# Altium footprint library ICs And Semiconductors SMD.PcbLib: 943 footprints (part 4 of 60)
Each footprint in its own frame and in the unit in brackets; x right, y up, seen from the top. Pads: shape width x height; smd on the part's side, far side on the other; paste and mask are expansions set on the pad; w line width, h text height; cw(c..) or ccw(c..) is an arc to the next point about the centre after c.
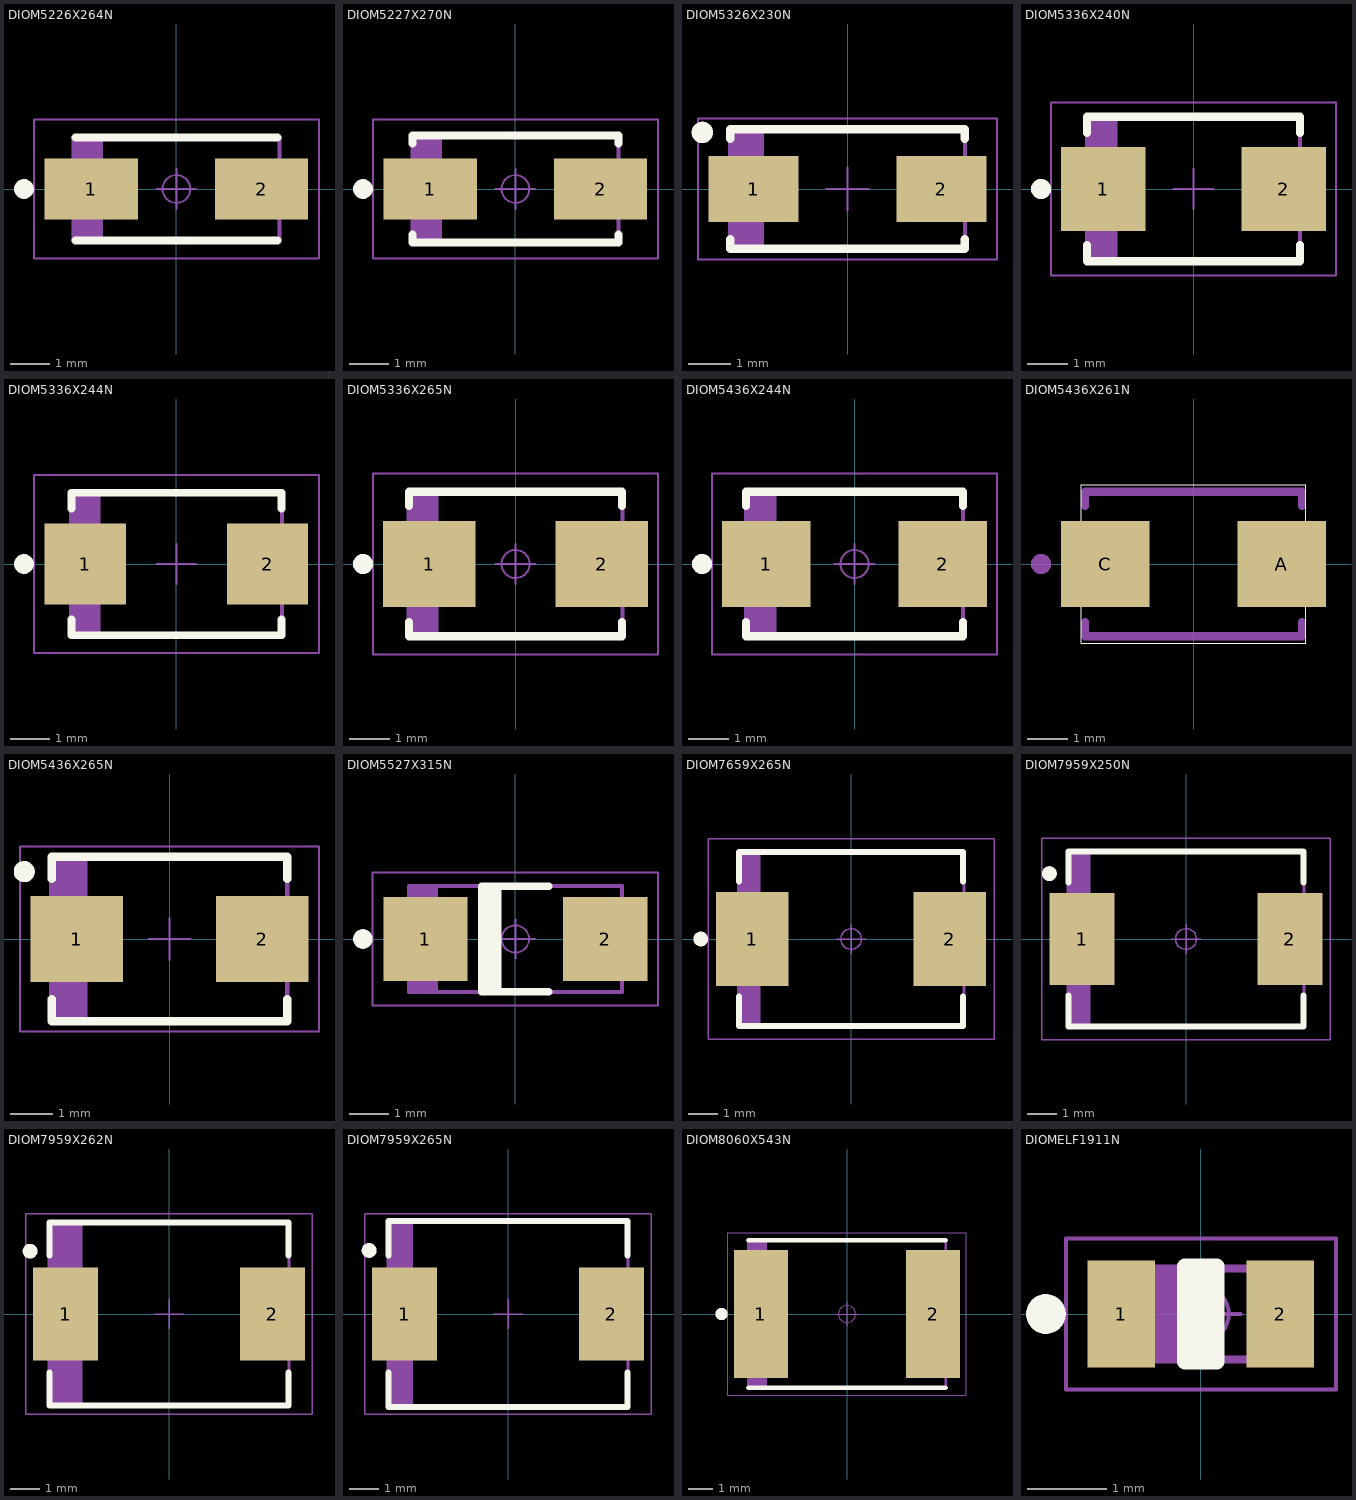
[diagram p3: the footprints below, top view; thin cyan lines are the x and y axes]

## DIOM5226X264N [mm] "DO-214-AC/SMA Diode, Molded Body; 5.195mm L X 2.585mm W X 2.64mm H, IPC Medium Density"
height 2.64
pads (2):
  rect 2.35x1.55 smd: 1(-2.15,0) 2(2.15,0)
Top Overlay:
  circle w0.25: c-3.85,0 r0.125
  lines w0.2: -2.55,-1.3 2.55,-1.3 ; -2.55,1.3 2.55,1.3
Mechanical 14:
  lines w0.1: -2.498,-1.292 -2.498,1.292 ; -2.398,-1.292 -2.398,1.292 ; -2.298,-1.292 -2.298,1.292 ; -2.198,-1.292 -2.198,1.292 ; -2.098,-1.292 -2.098,1.292 ; -1.998,-1.292 -1.998,1.292 ; -1.898,-1.292 -1.898,1.292 ; -2.598,-1.292 2.598,-1.292 2.598,1.292 -2.598,1.292 ; -2.598,-1.292 -2.598,1.292 ; -2.598,-1.292 -2.598,1.292
Mechanical 15:
  circle w0.05: c0,0 r0.35
  lines w0.05: -0.5,0 0.5,0 ; 0,-0.5 0,0.5 ; -3.6,-1.75 3.6,-1.75 3.6,1.75 -3.6,1.75 -3.6,-1.75
3D body "DIOM5226X264N.stp": height 2.64, standoff 0, extent -2.6,-1.3 2.6,1.305

## DIOM5227X270N [mm] "DO-214-AC/SMA Diode, Molded Body;5.20mm L X 2.725mm W X 2.70mm H, IPC Medium Density"
height 2.7
pads (2):
  rect 2.35x1.55 smd: 1(-2.15,0) 2(2.15,0)
Top Overlay:
  circle w0.25: c-3.85,0 r0.125
  lines w0.2: -2.6,-1.15 -2.6,-1.35 2.6,-1.35 2.6,-1.15 ; -2.6,1.15 -2.6,1.35 2.6,1.35 2.6,1.15
Mechanical 14:
  lines w0.1: -2.5,-1.362 -2.5,1.362 ; -2.4,-1.362 -2.4,1.362 ; -2.3,-1.362 -2.3,1.362 ; -2.2,-1.362 -2.2,1.362 ; -2.1,-1.362 -2.1,1.362 ; -2,-1.362 -2,1.362 ; -1.9,-1.362 -1.9,1.362 ; -2.6,-1.362 2.6,-1.362 2.6,1.362 -2.6,1.362 ; -2.6,-1.362 -2.6,1.362 ; -2.6,-1.362 -2.6,1.362
Mechanical 15:
  circle w0.05: c0,0 r0.35
  lines w0.05: -0.5,0 0.5,0 ; 0,-0.5 0,0.5 ; -3.6,-1.75 3.6,-1.75 3.6,1.75 -3.6,1.75 -3.6,-1.75
3D body "DIOM5227X270N.stp": height 2.7, standoff 0, extent -2.6,-1.3 2.6,1.305

## DIOM5326X230N [mm] "DO-214-AC/SMA Molded Diode, Body 5.3x2.6mm, IPC Medium Density"
height 2.3
pads (2):
  rect 2.1x1.55 smd: 1(-2.2,0) 2(2.2,0)
Top Overlay:
  circle w0.25: c-3.4,1.325 r0.125
  lines w0.2: -2.75,-1.175 -2.75,-1.4 2.75,-1.4 2.75,-1.175 ; -2.75,1.175 -2.75,1.4 2.75,1.4 2.75,1.175
Mechanical 14:
  lines w0.1: -2.66,-1.4 -2.66,1.4 ; -2.61,-1.4 -2.61,1.4 ; -2.535,-1.4 -2.535,1.4 ; -2.46,-1.4 -2.46,1.4 ; -2.385,-1.4 -2.385,1.4 ; -2.31,-1.4 -2.31,1.4 ; -2.235,-1.4 -2.235,1.4 ; -2.16,-1.4 -2.16,1.4 ; -2.085,-1.4 -2.085,1.4 ; -2.01,-1.4 -2.01,1.4 ; -2.75,-1.4 2.75,-1.4 2.75,1.4 -2.75,1.4 -2.75,-1.4
Mechanical 15:
  lines w0.05: -0.5,0 0.5,0 ; 0,-0.5 0,0.5 ; -3.5,-1.65 3.5,-1.65 3.5,1.65 -3.5,1.65 -3.5,-1.65
3D body "DIOM5326X230N.stp": height 2.3, standoff 0, extent -2.75,-1.4 2.75,1.4

## DIOM5336X240N [mm] "DO-214-AA/SMB Molded Diode, 2-Leads, Body 5.3x3.6mm, IPC Medium Density"
height 2.4
pads (2):
  rect 2.1x2.1 smd: 1(-2.25,0) 2(2.25,0)
Top Overlay:
  circle w0.25: c-3.8,0 r0.125
  lines w0.2: -2.65,-1.4 -2.65,-1.8 2.65,-1.8 2.65,-1.4 ; -2.65,1.4 -2.65,1.8 2.65,1.8 2.65,1.4
Mechanical 14:
  lines w0.1: -2.55,-1.775 -2.55,1.775 ; -2.45,-1.775 -2.45,1.775 ; -2.35,-1.775 -2.35,1.775 ; -2.25,-1.775 -2.25,1.775 ; -2.15,-1.775 -2.15,1.775 ; -2.05,-1.775 -2.05,1.775 ; -1.95,-1.775 -1.95,1.775 ; -2.65,-1.775 2.65,-1.775 2.65,1.775 -2.65,1.775 -2.65,-1.775
Mechanical 15:
  lines w0.05: -0.5,0 0.5,0 ; 0,-0.5 0,0.5 ; -3.55,-2.15 3.55,-2.15 3.55,2.15 -3.55,2.15 -3.55,-2.15
3D body "DIOM5336X240N.stp": height 2.4, standoff 0, extent -2.7,-1.95 2.7,1.95

## DIOM5336X244N [mm] "DO-214-AA/SMB Molded Diode, 2-Leads, Body 5.3x3.6mm, IPC Medium Density"
height 2.44
pads (2):
  rect 2.05x2.05 smd: 1(-2.3,0) 2(2.3,0)
Top Overlay:
  circle w0.25: c-3.85,0 r0.125
  lines w0.2: -2.65,-1.4 -2.65,-1.8 2.65,-1.8 2.65,-1.4 ; -2.65,1.4 -2.65,1.8 2.65,1.8 2.65,1.4
Mechanical 14:
  lines w0.1: -2.568,-1.81 -2.568,1.81 ; -2.468,-1.81 -2.468,1.81 ; -2.368,-1.81 -2.368,1.81 ; -2.268,-1.81 -2.268,1.81 ; -2.168,-1.81 -2.168,1.81 ; -2.068,-1.81 -2.068,1.81 ; -1.968,-1.81 -1.968,1.81 ; -2.668,-1.81 2.668,-1.81 2.668,1.81 -2.668,1.81 -2.668,-1.81
Mechanical 15:
  lines w0.05: -0.5,0 0.5,0 ; 0,-0.5 0,0.5 ; -3.6,-2.25 3.6,-2.25 3.6,2.25 -3.6,2.25 -3.6,-2.25
3D body "DIOM5336X244N.stp": height 2.44, standoff 0, extent -2.7,-1.95 2.7,1.95

## DIOM5336X265N [mm] "DO-214-AA/SMB Diode, Molded Body; 5.34mm L X 3.625mm W X 2.65mm H, IPC Medium Density"
height 2.65
pads (2):
  rect 2.3x2.15 smd: 1(-2.15,0) 2(2.15,0)
Top Overlay:
  circle w0.25: c-3.8,0 r0.125
  lines w0.2: -2.65,-1.45 -2.65,-1.8 2.65,-1.8 2.65,-1.45 ; -2.65,1.45 -2.65,1.8 2.65,1.8 2.65,1.45
Mechanical 14:
  lines w0.1: -2.57,-1.812 -2.57,1.812 ; -2.47,-1.812 -2.47,1.812 ; -2.37,-1.812 -2.37,1.812 ; -2.27,-1.812 -2.27,1.812 ; -2.17,-1.812 -2.17,1.812 ; -2.07,-1.812 -2.07,1.812 ; -1.97,-1.812 -1.97,1.812 ; -2.67,-1.812 2.67,-1.812 2.67,1.812 -2.67,1.812 ; -2.67,-1.812 -2.67,1.812 ; -2.67,-1.812 -2.67,1.812
Mechanical 15:
  circle w0.05: c0,0 r0.35
  lines w0.05: -0.5,0 0.5,0 ; 0,-0.5 0,0.5 ; -3.55,-2.25 3.55,-2.25 3.55,2.25 -3.55,2.25 -3.55,-2.25
3D body "DIOM5336X240N.stp": height 2.4, standoff 0, extent -2.7,-1.95 2.7,1.95

## DIOM5436X244N [mm] "DO-214-AA/SMB Diode, Molded Body; 5.40mm L X 3.62mm W X 2.44mm H, IPC Medium Density"
height 2.44
pads (2):
  rect 2.2x2.15 smd: 1(-2.2,0) 2(2.2,0)
Top Overlay:
  circle w0.25: c-3.8,0 r0.125
  lines w0.2: -2.7,-1.45 -2.7,-1.8 2.7,-1.8 2.7,-1.45 ; -2.7,1.45 -2.7,1.8 2.7,1.8 2.7,1.45
Mechanical 14:
  lines w0.1: -2.6,-1.81 -2.6,1.81 ; -2.5,-1.81 -2.5,1.81 ; -2.4,-1.81 -2.4,1.81 ; -2.3,-1.81 -2.3,1.81 ; -2.2,-1.81 -2.2,1.81 ; -2.1,-1.81 -2.1,1.81 ; -2,-1.81 -2,1.81 ; -2.7,-1.81 -2.7,1.81 ; -2.7,-1.81 -2.7,1.81 ; -2.7,-1.81 2.7,-1.81 2.7,1.81 -2.7,1.81
Mechanical 15:
  circle w0.05: c0,0 r0.35
  lines w0.05: -0.5,0 0.5,0 ; 0,-0.5 0,0.5 ; -3.55,-2.25 -3.55,2.25 3.55,2.25 3.55,-2.25 -3.55,-2.25
3D body "DIOM5436X244N.stp": height 2.44, standoff 0, extent -2.7,-1.95 2.7,1.95

## DIOM5436X261N [mm]
pads (2):
  rect 2.2x2.15 smd: A(2.2,0) C(-2.2,0)
Bottom Layer:
  text "1" at 0.45,-0.164 h0.75
Top Overlay:
  lines w0.001: -2.795,-1.97 -2.795,1.97 2.795,1.97 2.795,-1.97 -2.795,-1.97
Top Solder:
  circle w0.05: c0,0 r0.35
  lines w0.05: -0.5,0 0.5,0 ; 0,-0.5 0,0.5 ; -3.55,-2.25 -3.55,2.25 3.55,2.25 3.55,-2.25 -3.55,-2.25
Bottom Solder:
  lines w0.1: -2.6,-1.81 -2.6,1.81 ; -2.5,-1.81 -2.5,1.81 ; -2.4,-1.81 -2.4,1.81 ; -2.3,-1.81 -2.3,1.81 ; -2.2,-1.81 -2.2,1.81 ; -2.1,-1.81 -2.1,1.81 ; -2,-1.81 -2,1.81 ; -2.7,-1.81 -2.7,1.81 ; -2.7,-1.81 -2.7,1.81 ; -2.7,-1.81 2.7,-1.81 2.7,1.81 -2.7,1.81
  text "1" at -0.45,0.164 h0.75
Mechanical 15:
  circle w0.25: c-3.8,0 r0.125
  lines w0.2: -2.7,-1.45 -2.7,-1.8 2.7,-1.8 2.7,-1.45 ; -2.7,1.45 -2.7,1.8 2.7,1.8 2.7,1.45

## DIOM5436X265N [mm] "DO-214-AA/SMB Molded Diode, Body 5.4x3.6mm, IPC Medium Density"
height 2.65
pads (2):
  rect 2.2x2.05 smd: 1(-2.2,0) 2(2.2,0)
Top Overlay:
  circle w0.25: c-3.45,1.6 r0.125
  lines w0.2: -2.8,-1.425 -2.8,-1.95 2.8,-1.95 2.8,-1.425 ; -2.8,1.425 -2.8,1.95 2.8,1.95 2.8,1.425
Mechanical 13:
  lines w0.001: -2.845,-1.97 2.845,-1.97 2.845,1.97 -2.845,1.97 -2.845,-1.97 ; -2.795,-1.95 -2.795,1.95 2.795,1.95 2.795,-1.95 -2.795,-1.95
Mechanical 14:
  lines w0.1: -2.695,-1.95 -2.695,1.95 ; -2.595,-1.95 -2.595,1.95 ; -2.495,-1.95 -2.495,1.95 ; -2.395,-1.95 -2.395,1.95 ; -2.295,-1.95 -2.295,1.95 ; -2.195,-1.95 -2.195,1.95 ; -2.095,-1.95 -2.095,1.95 ; -1.995,-1.95 -1.995,1.95 ; -2.795,-1.95 -2.795,1.95 2.795,1.95 2.795,-1.95 -2.795,-1.95
Mechanical 15:
  lines w0.05: -0.5,0 0.5,0 ; 0,-0.5 0,0.5 ; -3.55,-2.2 -3.55,2.2 3.55,2.2 3.55,-2.2 -3.55,-2.2
3D body "DIOM5436X265N.stp": height 2.65, standoff 0, extent -2.8,-1.95 2.8,1.95

## DIOM5527X315N [mm] "DO-214-AC/SMB Diode, Molded Body; 5.45mm L X 2.705mm W X 3.15mm H, IPC Medium Density"
height 3.15
pads (2):
  rect 2.15x2.15 smd: 1(-2.3,0) 2(2.3,0)
Top Overlay:
  circle w0.25: c-3.9,0 r0.125
  lines w0.2: -0.65,-1.35 -0.65,1.35 ; -0.45,-1.35 -0.45,1.35 ; 0.85,-1.35 -0.85,-1.35 -0.85,1.35 0.85,1.35
Mechanical 14:
  lines w0.1: -2.625,-1.352 -2.625,1.352 ; -2.525,-1.352 -2.525,1.352 ; -2.425,-1.352 -2.425,1.352 ; -2.325,-1.352 -2.325,1.352 ; -2.225,-1.352 -2.225,1.352 ; -2.125,-1.352 -2.125,1.352 ; -2.025,-1.352 -2.025,1.352 ; -2.725,-1.352 -2.725,1.352 ; -2.725,-1.352 -2.725,1.352 ; -2.725,-1.352 2.725,-1.352 2.725,1.352 -2.725,1.352
Mechanical 15:
  circle w0.05: c0,0 r0.35
  lines w0.05: -0.5,0 0.5,0 ; 0,-0.5 0,0.5 ; -3.65,-1.7 -3.65,1.7 3.65,1.7 3.65,-1.7 -3.65,-1.7
3D body "DIOM5527X315N.stp": height 3.15, standoff 0, extent -2.845,-1.42 2.845,1.42

## DIOM7659X265N [mm] "DO-214-AB/SMC Molded Diode, Body 7.95x5.9mm, IPC Medium Density"
height 2.65
pads (2):
  rect 2.45x3.2 smd: 1(-3.35,0) 2(3.35,0)
Top Overlay:
  circle w0.25: c-5.1,0 r0.125
  lines w0.2: -3.8,-1.95 -3.8,-2.95 3.8,-2.95 3.8,-1.95 ; -3.8,1.95 -3.8,2.95 3.8,2.95 3.8,1.95
Mechanical 14:
  lines w0.1: -3.725,-2.95 -3.725,2.95 ; -3.625,-2.95 -3.625,2.95 ; -3.525,-2.95 -3.525,2.95 ; -3.425,-2.95 -3.425,2.95 ; -3.325,-2.95 -3.325,2.95 ; -3.225,-2.95 -3.225,2.95 ; -3.125,-2.95 -3.125,2.95 ; -3.825,-2.95 -3.825,2.95 3.825,2.95 3.825,-2.95 -3.825,-2.95
Mechanical 15:
  circle w0.05: c0,0 r0.35
  lines w0.05: -0.5,0 0.5,0 ; 0,-0.5 0,0.5 ; -4.85,-3.4 -4.85,3.4 4.85,3.4 4.85,-3.4 -4.85,-3.4
3D body "DIOM7659X265N.stp": height 2.65, standoff 0, extent -3.975,-2.95 3.975,2.95

## DIOM7959X250N [mm] "DO-214-AB/SMC Molded Diode, Body 7.9x5.9mm, IPC Medium Density"
height 2.5
pads (2):
  rect 2.2x3.1 smd: 1(-3.5,0) 2(3.5,0)
Top Overlay:
  circle w0.25: c-4.6,2.2 r0.125
  lines w0.2: -3.95,-1.9 -3.95,-2.95 3.95,-2.95 3.95,-1.9 ; -3.95,1.9 -3.95,2.95 3.95,2.95 3.95,1.9
Mechanical 14:
  lines w0.1: -3.87,-2.952 -3.87,2.952 ; -3.77,-2.952 -3.77,2.952 ; -3.67,-2.952 -3.67,2.952 ; -3.57,-2.952 -3.57,2.952 ; -3.47,-2.952 -3.47,2.952 ; -3.37,-2.952 -3.37,2.952 ; -3.27,-2.952 -3.27,2.952 ; -3.97,-2.952 -3.97,2.952 ; -3.97,-2.952 -3.97,2.952 ; -3.97,-2.952 3.97,-2.952 3.97,2.952 -3.97,2.952
Mechanical 15:
  circle w0.05: c0,0 r0.35
  lines w0.05: -0.5,0 0.5,0 ; 0,-0.5 0,0.5 ; -4.85,-3.4 -4.85,3.4 4.85,3.4 4.85,-3.4 -4.85,-3.4
3D body "DIOM7959X250N.stp": height 2.5, standoff 0, extent -4.065,-3.11 4.065,3.11

## DIOM7959X262N [mm] "DO-214-AB/SMC Molded Diode, Body 7.9x5.9mm, IPC Medium Density"
height 2.62
pads (2):
  rect 2.2x3.15 smd: 1(-3.5,0) 2(3.5,0)
Top Overlay:
  circle w0.25: c-4.7,2.125 r0.125
  lines w0.2: -4.05,-1.975 -4.05,-3.1 4.05,-3.1 4.05,-1.975 ; -4.05,1.975 -4.05,3.1 4.05,3.1 4.05,1.975
Mechanical 14:
  lines w0.1: -4,-3.11 -4,3.11 ; -3.95,-3.11 -3.95,3.11 ; -3.875,-3.11 -3.875,3.11 ; -3.8,-3.11 -3.8,3.11 ; -3.725,-3.11 -3.725,3.11 ; -3.65,-3.11 -3.65,3.11 ; -3.575,-3.11 -3.575,3.11 ; -3.5,-3.11 -3.5,3.11 ; -3.425,-3.11 -3.425,3.11 ; -3.35,-3.11 -3.35,3.11 ; -3.275,-3.11 -3.275,3.11 ; -3.2,-3.11 -3.2,3.11 ; -3.125,-3.11 -3.125,3.11 ; -3.05,-3.11 -3.05,3.11 ; -2.975,-3.11 -2.975,3.11 ; -4.065,-3.11 -4.065,3.11 4.065,3.11 4.065,-3.11 -4.065,-3.11
Mechanical 15:
  lines w0.05: -0.5,0 0.5,0 ; 0,-0.5 0,0.5 ; -4.85,-3.4 -4.85,3.4 4.85,3.4 4.85,-3.4 -4.85,-3.4
3D body "DIOM7959X262N.stp": height 2.62, standoff 0, extent -4.065,-3.11 4.065,3.11

## DIOM7959X265N [mm] "DO-214-AB/SMC Molded Diode, Body 7.9x5.9mm, IPC Medium Density"
height 2.65
pads (2):
  rect 2.2x3.15 smd: 1(-3.5,0) 2(3.5,0)
Top Overlay:
  circle w0.25: c-4.7,2.15 r0.125
  lines w0.2: -4.05,-1.975 -4.05,-3.15 4.05,-3.15 4.05,-1.975 ; -4.05,1.975 -4.05,3.15 4.05,3.15 4.05,1.975
Mechanical 13:
  lines w0.001: -4.065,-3.15 -4.065,3.15 4.065,3.15 4.065,-3.15 -4.065,-3.15
Mechanical 14:
  lines w0.1: -3.965,-3.15 -3.965,3.15 ; -3.865,-3.15 -3.865,3.15 ; -3.765,-3.15 -3.765,3.15 ; -3.665,-3.15 -3.665,3.15 ; -3.565,-3.15 -3.565,3.15 ; -3.465,-3.15 -3.465,3.15 ; -3.365,-3.15 -3.365,3.15 ; -3.265,-3.15 -3.265,3.15 ; -4.065,-3.15 -4.065,3.15 4.065,3.15 4.065,-3.15 -4.065,-3.15
Mechanical 15:
  lines w0.05: -0.5,0 0.5,0 ; 0,-0.5 0,0.5 ; -4.85,-3.4 -4.85,3.4 4.85,3.4 4.85,-3.4 -4.85,-3.4
3D body "DIOM7959X265N.stp": height 2.65, standoff 0, extent -4.065,-3.11 4.065,3.11

## DIOM8060X543N [mm] "DO-214-AB (HSMC) Molded Diode, Body 6.025 x 6.13mm, IPC Medium Density"
height 5.43
pads (2):
  rect 2.2x5.2 smd: 1(-3.5,0) 2(3.5,0)
Top Overlay:
  circle w0.25: c-5.1,0 r0.125
  lines w0.2: -4,-3 4,-3 ; -4,3 4,3
Mechanical 14:
  lines w0.1: -3.908,-3.012 -3.908,3.012 ; -3.808,-3.012 -3.808,3.012 ; -3.708,-3.012 -3.708,3.012 ; -3.608,-3.012 -3.608,3.012 ; -3.508,-3.012 -3.508,3.012 ; -3.408,-3.012 -3.408,3.012 ; -3.308,-3.012 -3.308,3.012 ; -4.008,-3.012 4.008,-3.012 4.008,3.012 -4.008,3.012 ; -4.008,-3.012 -4.008,3.012 ; -4.008,-3.012 -4.008,3.012
Mechanical 15:
  circle w0.05: c0,0 r0.35
  lines w0.05: -0.5,0 0.5,0 ; 0,-0.5 0,0.5 ; -4.85,-3.3 4.85,-3.3 4.85,3.3 -4.85,3.3 -4.85,-3.3
3D body "DIOM8060X543N.stp": height 5.43, standoff 0, extent -4.09,-3.05 4.09,3.05

## DIOMELF1911N [mm] "MELF Diode, 2-Leads, Body 1.7x1.15mm, IPC Medium Density"
height 1.2
pads (2):
  rect 0.85x1.35 smd: 1(-1,0) 2(1,0)
Top Overlay:
  circle w0.25: c-1.95,0 r0.125
  lines w0.2: 0,-0.6 0,0.6 ; -0.2,-0.6 0.2,-0.6 0.2,0.6 -0.2,0.6 -0.2,-0.6
Mechanical 14:
  lines w0.1: -0.85,-0.575 -0.85,0.575 ; -0.75,-0.575 -0.75,0.575 ; -0.65,-0.575 -0.65,0.575 ; -0.55,-0.575 -0.55,0.575 ; -0.45,-0.575 -0.45,0.575 ; -0.35,-0.575 -0.35,0.575 ; -0.25,-0.575 -0.25,0.575 ; -0.95,-0.575 0.95,-0.575 0.95,0.575 -0.95,0.575 ; -0.95,-0.575 -0.95,0.575 ; -0.95,-0.575 -0.95,0.575
Mechanical 15:
  circle w0.05: c0,0 r0.35
  lines w0.05: -0.5,0 0.5,0 ; 0,-0.5 0,0.5 ; -1.7,-0.95 1.7,-0.95 1.7,0.95 -1.7,0.95 -1.7,-0.95
3D body "DIOMELF1911N.stp": height 1.2, standoff 0, extent -1,-0.6 1,0.6